# Altium footprint library ICs And Semiconductors THD.PcbLib: 507 footprints (part 17 of 32)
Each footprint in its own frame and in the unit in brackets; x right, y up, seen from the top. Pads: shape width x height; smd on the part's side, far side on the other; paste and mask are expansions set on the pad; w line width, h text height; cw(c..) or ccw(c..) is an arc to the next point about the centre after c.
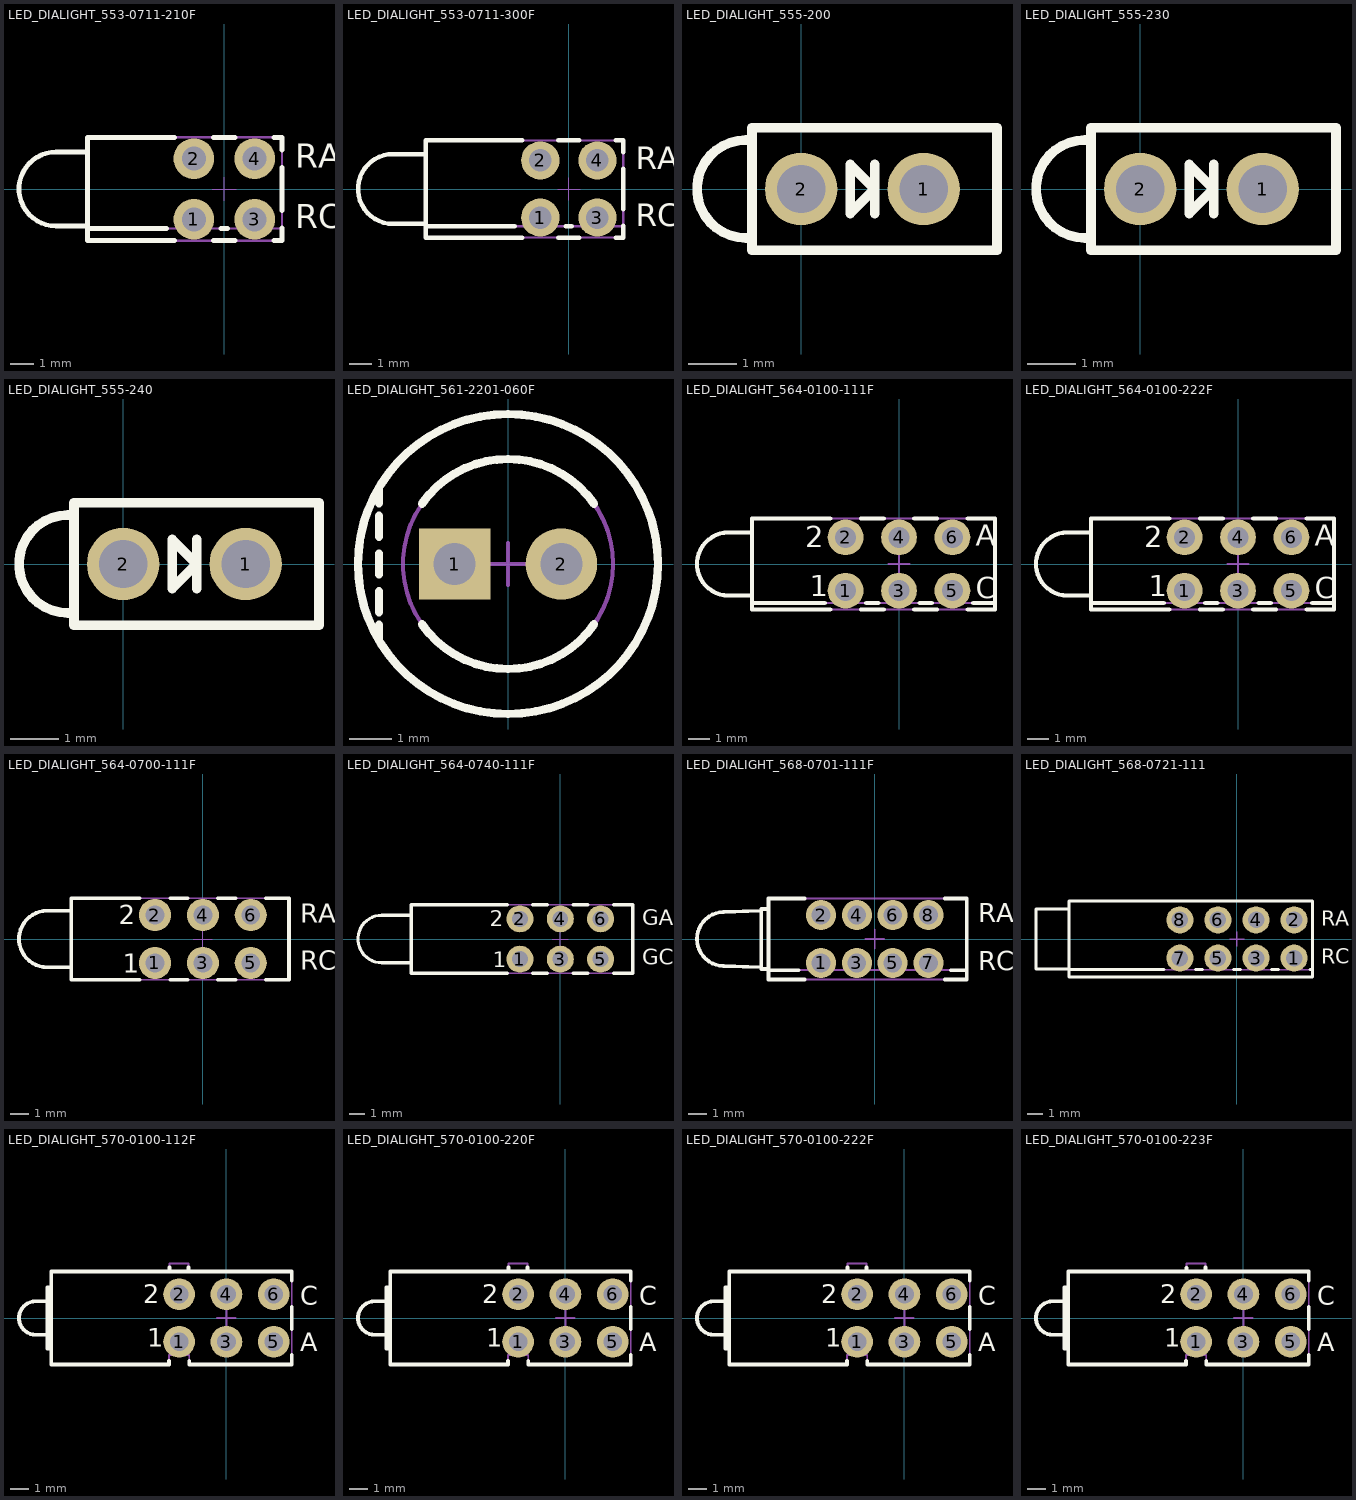
[diagram p16: the footprints below, top view; thin cyan lines are the x and y axes]

## LED_DIALIGHT_553-0711-210F [mm] "Bi-Level 2x3mm Bi-Color Red/Green, LED CBI Circuit Board Indicator"
height 9.65
pads (4):
  round 1.7 hole 1: 1(-1.27,-1.27) 2(-1.27,1.27) 3(1.27,-1.27) 4(1.27,1.27)
Top Overlay:
  lines w0.2: -7.036,1.549 -5.715,1.549 ; -7.022,1.549 ccw(c-7.036,0) -7.036,-1.549 -5.715,-1.549 ; -5.715,-1.651 -2.408,-1.651 ; -2.076,-2.159 -5.715,-2.159 -5.715,2.159 -2.076,2.159 ; -0.464,-2.159 0.464,-2.159 ; -0.464,2.159 0.464,2.159 ; -0.132,-1.651 0.132,-1.651 ; 2.076,-2.159 2.413,-2.159 2.413,-1.635 ; 2.076,2.159 2.413,2.159 2.413,1.635 ; 2.413,-0.905 2.413,0.905
  text "RA" at 2.962,0.889 h1
  text "RC" at 2.962,-1.651 h1
Notvisible:
  lines w0.05: -1.77,-1.27 -1.27,-1.27 ; -1.77,1.27 -1.27,1.27 ; -1.27,-1.77 -1.27,-1.27 ; -1.27,-0.77 -1.27,-1.27 ; -1.27,0.77 -1.27,1.27 ; -1.27,1.77 -1.27,1.27 ; -0.77,-1.27 -1.27,-1.27 ; -0.77,1.27 -1.27,1.27 ; -0.5,0 0,0 ; 0,-0.5 0,0 ; 0,0.5 0,0 ; 0.5,0 0,0 ; 0.77,-1.27 1.27,-1.27 ; 0.77,1.27 1.27,1.27 ; 1.27,-1.77 1.27,-1.27 ; 1.27,-0.77 1.27,-1.27 ; 1.27,0.77 1.27,1.27 ; 1.27,1.77 1.27,1.27 ; 1.77,-1.27 1.27,-1.27 ; 1.77,1.27 1.27,1.27
Mechanical 14:
  lines w0.1: -7.036,1.549 -5.715,1.549 ; -7.022,1.549 ccw(c-7.036,0) -7.036,-1.549 -5.715,-1.549 ; -5.715,-1.651 2.413,-1.651 ; -5.715,-2.159 -5.715,2.159 2.413,2.159 2.413,-2.159 -5.715,-2.159
  text "RA" at 2.963,0.889 h1
  text "RC" at 2.963,-1.651 h1
3D body "LED_DIALIGHT_553-0711-210F.stp": height 9.65, standoff -3.68, extent -8.585,-2.159 2.413,2.159

## LED_DIALIGHT_553-0711-300F [mm] "Bi-Level 2x3mm Bi-Color Red/Green, LED CBI Circuit Board Indicator"
height 9.65
pads (4):
  round 1.7 hole 1: 1(-1.27,-1.27) 2(-1.27,1.27) 3(1.27,-1.27) 4(1.27,1.27)
Top Overlay:
  lines w0.2: -7.826,1.549 -6.355,1.549 ; -7.812,1.549 ccw(c-7.826,0) -7.826,-1.549 -6.355,-1.549 ; -6.355,-1.651 -2.408,-1.651 ; -2.076,-2.159 -6.355,-2.159 -6.355,2.159 -2.076,2.159 ; -0.464,-2.159 0.464,-2.159 ; -0.464,2.159 0.464,2.159 ; -0.132,-1.651 0.132,-1.651 ; 2.076,-2.159 2.413,-2.159 2.413,-1.635 ; 2.076,2.159 2.413,2.159 2.413,1.635 ; 2.413,-0.905 2.413,0.905
  text "RC" at 2.962,-1.651 h1
  text "RA" at 2.962,0.889 h1
Notvisible:
  lines w0.05: -1.77,-1.27 -1.27,-1.27 ; -1.77,1.27 -1.27,1.27 ; -1.27,-1.77 -1.27,-1.27 ; -1.27,-0.77 -1.27,-1.27 ; -1.27,0.77 -1.27,1.27 ; -1.27,1.77 -1.27,1.27 ; -0.77,-1.27 -1.27,-1.27 ; -0.77,1.27 -1.27,1.27 ; -0.5,0 0,0 ; 0,-0.5 0,0 ; 0,0.5 0,0 ; 0.5,0 0,0 ; 0.77,-1.27 1.27,-1.27 ; 0.77,1.27 1.27,1.27 ; 1.27,-1.77 1.27,-1.27 ; 1.27,-0.77 1.27,-1.27 ; 1.27,0.77 1.27,1.27 ; 1.27,1.77 1.27,1.27 ; 1.77,-1.27 1.27,-1.27 ; 1.77,1.27 1.27,1.27
Mechanical 14:
  lines w0.1: -7.826,1.549 -6.355,1.549 ; -7.812,1.549 ccw(c-7.826,0) -7.826,-1.549 -6.355,-1.549 ; -6.355,-1.651 2.413,-1.651 ; -6.355,-2.159 2.413,-2.159 2.413,2.159 -6.355,2.159 -6.355,-2.159
  text "RC" at 2.963,-1.651 h1
  text "RA" at 2.963,0.889 h1
3D body "LED_DIALIGHT_553-0711-300F.stp": height 9.65, standoff -3.68, extent -9.375,-2.159 2.413,2.159

## LED_DIALIGHT_555-200 [mm] "Single 2mm Red LED, Body 5.08x2.54mm, Pin spacing 2.54mm"
height 6.35
pads (2):
  round 1.5 hole 1: 1(2.54,0) 2(0,0)
Top Overlay:
  lines w0.2: -1.02,-1.015 -1.145,-1.015 cw(c-1.145,0) -1.145,1.015 -1.02,1.015 ; 1.524,-0.508 1.524,0.508 ; -1.02,-1.27 -1.02,1.27 4.06,1.27 4.06,-1.27 -1.02,-1.27 ; 1.016,-0.508 1.016,0.508 1.524,0 1.016,-0.508
Notvisible:
  lines w0.05: -0.127,-0.343 0.127,-0.343 0.127,0.343 -0.127,0.343 -0.127,-0.343 ; 2.413,-0.343 2.667,-0.343 2.667,0.343 2.413,0.343 2.413,-0.343
Mechanical 14:
  lines w0.1: -1.02,-1.015 -1.145,-1.015 cw(c-1.145,0) -1.145,1.015 -1.02,1.015 ; 1.524,-0.508 1.524,0.508 ; -1.02,-1.27 -1.02,1.27 4.06,1.27 4.06,-1.27 -1.02,-1.27 ; 1.016,-0.508 1.016,0.508 1.524,0 1.016,-0.508
3D body "LED_DIALIGHT_555-200.stp": height 6.35, standoff -3.6, extent -2.16,-1.27 4.06,1.27

## LED_DIALIGHT_555-230 [mm] "Single 2mm Green LED, Body 5.08x2.54mm, Pin spacing 2.54mm"
height 6.35
pads (2):
  round 1.5 hole 1: 1(2.54,0) 2(0,0)
Top Overlay:
  lines w0.2: -1.02,-1.015 -1.145,-1.015 cw(c-1.145,0) -1.145,1.015 -1.02,1.015 ; 1.524,-0.508 1.524,0.508 ; -1.02,-1.27 -1.02,1.27 4.06,1.27 4.06,-1.27 -1.02,-1.27 ; 1.016,-0.508 1.016,0.508 1.524,0 1.016,-0.508
Notvisible:
  lines w0.05: -0.127,-0.343 0.127,-0.343 0.127,0.343 -0.127,0.343 -0.127,-0.343 ; 2.413,-0.343 2.667,-0.343 2.667,0.343 2.413,0.343 2.413,-0.343
Mechanical 14:
  lines w0.1: -1.02,-1.015 -1.145,-1.015 cw(c-1.145,0) -1.145,1.015 -1.02,1.015 ; 1.524,-0.508 1.524,0.508 ; -1.02,-1.27 -1.02,1.27 4.06,1.27 4.06,-1.27 -1.02,-1.27 ; 1.016,-0.508 1.016,0.508 1.524,0 1.016,-0.508
3D body "LED_DIALIGHT_555-230.stp": height 6.35, standoff -3.6, extent -2.16,-1.27 4.06,1.27

## LED_DIALIGHT_555-240 [mm] "Single 2mm Yellow LED, Body 5.08x2.54mm, Pin spacing 2.54mm"
height 6.35
pads (2):
  round 1.5 hole 1: 1(2.54,0) 2(0,0)
Top Overlay:
  lines w0.2: -1.02,-1.015 -1.145,-1.015 cw(c-1.145,0) -1.145,1.015 -1.02,1.015 ; 1.524,-0.508 1.524,0.508 ; -1.02,-1.27 4.06,-1.27 4.06,1.27 -1.02,1.27 -1.02,-1.27 ; 1.016,-0.508 1.524,0 1.016,0.508 1.016,-0.508
Notvisible:
  lines w0.05: -0.127,-0.343 -0.127,0.343 0.127,0.343 0.127,-0.343 -0.127,-0.343 ; 2.413,-0.343 2.413,0.343 2.667,0.343 2.667,-0.343 2.413,-0.343
Mechanical 14:
  lines w0.1: -1.02,-1.015 -1.145,-1.015 cw(c-1.145,0) -1.145,1.015 -1.02,1.015 ; 1.524,-0.508 1.524,0.508 ; -1.02,-1.27 4.06,-1.27 4.06,1.27 -1.02,1.27 -1.02,-1.27 ; 1.016,-0.508 1.524,0 1.016,0.508 1.016,-0.508
3D body "LED_DIALIGHT_555-240.stp": height 6.35, standoff -3.6, extent -2.16,-1.27 4.06,1.27

## LED_DIALIGHT_561-2201-060F [mm] "Single Vertical 5mm Green LED With Housing Stand-off (D 7.1mmx H 9.52mm), Overall Height 15.24mm"
height 15.24
pads (2):
  rect 1.7x1.7 hole 1: 1(-1.27,0)
  round 1.7 hole 1: 2(1.27,0)
Top Overlay:
  circle w0.2: c0,0 r3.57
  lines w0.2: -3.07,-1.822 -3.07,-1.45 ; -3.07,-1.15 -3.07,-0.65 ; -3.07,-0.25 -3.07,0.25 ; -3.07,0.65 -3.07,1.15 ; -3.07,1.45 -3.07,1.822 ; -2.048,-1.434 ccw(c0,0) 2.048,-1.434 ; -2.048,1.434 cw(c0,0) 2.048,1.434
Notvisible:
  lines w0.1: -1.77,0 -1.27,0 ; -1.27,-0.5 -1.27,0 ; -1.27,0.5 -1.27,0 ; -0.77,0 -1.27,0 ; -0.5,0 0,0 ; 0,-0.5 0,0 ; 0,0.5 0,0 ; 0.5,0 0,0 ; 0.77,0 1.27,0 ; 1.27,-0.5 1.27,0 ; 1.27,0.5 1.27,0 ; 1.77,0 1.27,0
Mechanical 14:
  circle w0.1: c0,0 r3.57
  circle w0.1: c0,0 r2.5
  lines w0.1: -3.07,-1.822 -3.07,-1.45 ; -3.07,-1.15 -3.07,-0.65 ; -3.07,-0.25 -3.07,0.25 ; -3.07,0.65 -3.07,1.15 ; -3.07,1.45 -3.07,1.822
3D body "LED_DIALIGHT_561-2201-060F.stp": height 15.24, standoff -3.8, extent -3.57,-3.57 3.57,3.57

## LED_DIALIGHT_564-0100-111F [mm] "3x Red LED 3mm PCB Edge Mounting DIALIGHT 564 Series"
height 15.24
pads (6):
  round 1.7 hole 1: 1(-2.54,-1.27) 2(-2.54,1.27) 3(0,-1.27) 4(0,1.27) 5(2.54,-1.27) 6(2.54,1.27)
Top Overlay:
  lines w0.2: -6.99,-1.86 -3.527,-1.86 ; -6.99,-1.5 -8.106,-1.5 cw(c-8.106,0) -8.106,1.5 -6.99,1.5 ; -3.268,-2.16 -6.99,-2.16 -6.99,2.16 -3.268,2.16 ; -1.812,-2.16 -0.728,-2.16 ; -1.812,2.16 -0.728,2.16 ; -1.553,-1.86 -0.987,-1.86 ; 0.728,-2.16 1.812,-2.16 ; 0.728,2.16 1.812,2.16 ; 0.987,-1.86 1.553,-1.86 ; 3.268,-2.16 4.57,-2.16 4.57,2.16 3.268,2.16 ; 3.527,-1.86 4.57,-1.86
  text "1" at -4.243,-1.53 h1
  text "2" at -4.458,0.79 h1
  text "C" at 3.66,-1.635 h1
  text "A" at 3.66,0.86 h1
Notvisible:
  lines w0.1: -3.04,-1.27 -2.54,-1.27 ; -3.04,1.27 -2.54,1.27 ; -2.54,-1.77 -2.54,-1.27 ; -2.54,-0.77 -2.54,-1.27 ; -2.54,0.77 -2.54,1.27 ; -2.54,1.77 -2.54,1.27 ; -2.04,-1.27 -2.54,-1.27 ; -2.04,1.27 -2.54,1.27 ; -0.5,-1.27 0,-1.27 ; -0.5,0 0,0 ; -0.5,1.27 0,1.27 ; 0,-1.77 0,-1.27 ; 0,-0.77 0,-1.27 ; 0,-0.5 0,0 ; 0,0.5 0,0 ; 0,0.77 0,1.27 ; 0,1.77 0,1.27 ; 0.5,-1.27 0,-1.27 ; 0.5,0 0,0 ; 0.5,1.27 0,1.27 ; 2.04,-1.27 2.54,-1.27 ; 2.04,1.27 2.54,1.27 ; 2.54,-1.77 2.54,-1.27 ; 2.54,-0.77 2.54,-1.27 ; 2.54,0.77 2.54,1.27 ; 2.54,1.77 2.54,1.27 ; 3.04,-1.27 2.54,-1.27 ; 3.04,1.27 2.54,1.27
Mechanical 14:
  lines w0.1: -6.99,-1.86 4.57,-1.86 ; -6.99,-1.5 -8.106,-1.5 cw(c-8.106,0) -8.106,1.5 -6.99,1.5 ; -6.99,-2.16 -6.99,2.16 4.57,2.16 4.57,-2.16 -6.99,-2.16
  text "1" at -4.243,-1.53 h1
  text "2" at -4.458,0.79 h1
  text "C" at 3.66,-1.635 h1
  text "A" at 3.66,0.86 h1
3D body "LED_DIALIGHT_564-0100-111F.stp": height 15.24, standoff -3.2, extent -9.606,-2.16 4.57,2.16

## LED_DIALIGHT_564-0100-222F [mm] "3x Green LED 3mm PCB Edge Mounting DIALIGHT 564 Series"
height 15.24
pads (6):
  round 1.7 hole 1: 1(-2.54,-1.27) 2(-2.54,1.27) 3(0,-1.27) 4(0,1.27) 5(2.54,-1.27) 6(2.54,1.27)
Top Overlay:
  lines w0.2: -6.99,-1.86 -3.527,-1.86 ; -6.99,-1.5 -8.106,-1.5 cw(c-8.106,0) -8.106,1.5 -6.99,1.5 ; -3.268,-2.16 -6.99,-2.16 -6.99,2.16 -3.268,2.16 ; -1.812,-2.16 -0.728,-2.16 ; -1.812,2.16 -0.728,2.16 ; -1.553,-1.86 -0.987,-1.86 ; 0.728,-2.16 1.812,-2.16 ; 0.728,2.16 1.812,2.16 ; 0.987,-1.86 1.553,-1.86 ; 3.268,-2.16 4.57,-2.16 4.57,2.16 3.268,2.16 ; 3.527,-1.86 4.57,-1.86
  text "1" at -4.243,-1.53 h1
  text "2" at -4.458,0.79 h1
  text "C" at 3.66,-1.635 h1
  text "A" at 3.66,0.86 h1
Notvisible:
  lines w0.1: -3.04,-1.27 -2.54,-1.27 ; -3.04,1.27 -2.54,1.27 ; -2.54,-1.77 -2.54,-1.27 ; -2.54,-0.77 -2.54,-1.27 ; -2.54,0.77 -2.54,1.27 ; -2.54,1.77 -2.54,1.27 ; -2.04,-1.27 -2.54,-1.27 ; -2.04,1.27 -2.54,1.27 ; -0.5,-1.27 0,-1.27 ; -0.5,0 0,0 ; -0.5,1.27 0,1.27 ; 0,-1.77 0,-1.27 ; 0,-0.77 0,-1.27 ; 0,-0.5 0,0 ; 0,0.5 0,0 ; 0,0.77 0,1.27 ; 0,1.77 0,1.27 ; 0.5,-1.27 0,-1.27 ; 0.5,0 0,0 ; 0.5,1.27 0,1.27 ; 2.04,-1.27 2.54,-1.27 ; 2.04,1.27 2.54,1.27 ; 2.54,-1.77 2.54,-1.27 ; 2.54,-0.77 2.54,-1.27 ; 2.54,0.77 2.54,1.27 ; 2.54,1.77 2.54,1.27 ; 3.04,-1.27 2.54,-1.27 ; 3.04,1.27 2.54,1.27
Mechanical 14:
  lines w0.1: -6.99,-1.86 4.57,-1.86 ; -6.99,-1.5 -8.106,-1.5 cw(c-8.106,0) -8.106,1.5 -6.99,1.5 ; -6.99,-2.16 -6.99,2.16 4.57,2.16 4.57,-2.16 -6.99,-2.16
  text "1" at -4.243,-1.53 h1
  text "2" at -4.458,0.79 h1
  text "C" at 3.66,-1.635 h1
  text "A" at 3.66,0.86 h1
3D body "LED_DIALIGHT_564-0100-222F.stp": height 15.24, standoff -3.2, extent -9.606,-2.16 4.57,2.16

## LED_DIALIGHT_564-0700-111F [mm] "3x Red-Green Led 3mm PCB Edge Mounting DIALIGHT 564 Series"
height 15.24
pads (6):
  round 1.7 hole 1: 1(-2.54,-1.27) 2(-2.54,1.27) 3(0,-1.27) 4(0,1.27) 5(2.54,-1.27) 6(2.54,1.27)
Top Overlay:
  lines w0.2: -8.26,1.499 ccw(c-8.255,0) -8.255,-1.499 -6.985,-1.499 ; -8.255,1.499 -6.985,1.499 ; -3.346,-2.159 -6.985,-2.159 -6.985,2.159 -3.346,2.159 ; -1.734,-2.159 -0.806,-2.159 ; -1.734,2.159 -0.806,2.159 ; 0.806,-2.159 1.734,-2.159 ; 0.806,2.159 1.734,2.159 ; 3.346,-2.159 4.572,-2.159 4.572,2.159 3.346,2.159
  text "1" at -4.243,-1.78 h1
  text "2" at -4.458,0.79 h1
  text "RC" at 5.16,-1.635 h1
  text "RA" at 5.16,0.86 h1
Notvisible:
  lines w0.05: -3.04,-1.27 -2.54,-1.27 ; -3.04,1.27 -2.54,1.27 ; -2.54,-1.77 -2.54,-1.27 ; -2.54,-0.77 -2.54,-1.27 ; -2.54,0.77 -2.54,1.27 ; -2.54,1.77 -2.54,1.27 ; -2.04,-1.27 -2.54,-1.27 ; -2.04,1.27 -2.54,1.27 ; -0.5,-1.27 0,-1.27 ; -0.5,0 0,0 ; -0.5,1.27 0,1.27 ; 0,-1.77 0,-1.27 ; 0,-0.77 0,-1.27 ; 0,-0.5 0,0 ; 0,0.5 0,0 ; 0,0.77 0,1.27 ; 0,1.77 0,1.27 ; 0.5,-1.27 0,-1.27 ; 0.5,0 0,0 ; 0.5,1.27 0,1.27 ; 2.04,-1.27 2.54,-1.27 ; 2.04,1.27 2.54,1.27 ; 2.54,-1.77 2.54,-1.27 ; 2.54,-0.77 2.54,-1.27 ; 2.54,0.77 2.54,1.27 ; 2.54,1.77 2.54,1.27 ; 3.04,-1.27 2.54,-1.27 ; 3.04,1.27 2.54,1.27
Mechanical 14:
  lines w0.1: -8.26,1.499 ccw(c-8.255,0) -8.255,-1.499 -6.985,-1.499 ; -8.255,1.499 -6.985,1.499 ; -6.985,-2.159 -6.985,2.159 4.572,2.159 4.572,-2.159 -6.985,-2.159
  text "1" at -4.243,-1.78 h1
  text "2" at -4.458,0.79 h1
  text "RC" at 5.16,-1.635 h1
  text "RA" at 5.16,0.86 h1
3D body "LED_DIALIGHT_564-0700-111F.stp": height 15.24, standoff -3.68, extent -9.754,-2.159 4.572,2.159

## LED_DIALIGHT_564-0740-111F [mm] "3x Red-Green Led 3mm PCB Edge Mounting DIALIGHT 564 Series"
height 15.24
pads (6):
  round 1.7 hole 1: 1(-2.54,-1.27) 2(-2.54,1.27) 3(0,-1.27) 4(0,1.27) 5(2.54,-1.27) 6(2.54,1.27)
Top Overlay:
  lines w0.2: -11.257,1.499 ccw(c-11.252,0) -11.252,-1.499 -9.398,-1.499 ; -11.252,1.499 -9.398,1.499 ; -3.346,-2.159 -9.398,-2.159 -9.398,2.159 -3.346,2.159 ; -1.734,-2.159 -0.806,-2.159 ; -1.734,2.159 -0.806,2.159 ; 0.806,-2.159 1.734,-2.159 ; 0.806,2.159 1.734,2.159 ; 3.346,-2.159 4.572,-2.159 4.572,2.159 3.346,2.159
  text "1" at -4.243,-1.78 h1
  text "2" at -4.458,0.79 h1
  text "GC" at 5.16,-1.635 h1
  text "GA" at 5.16,0.86 h1
Notvisible:
  lines w0.05: -3.04,-1.27 -2.54,-1.27 ; -3.04,1.27 -2.54,1.27 ; -2.54,-1.77 -2.54,-1.27 ; -2.54,-0.77 -2.54,-1.27 ; -2.54,0.77 -2.54,1.27 ; -2.54,1.77 -2.54,1.27 ; -2.04,-1.27 -2.54,-1.27 ; -2.04,1.27 -2.54,1.27 ; -0.5,-1.27 0,-1.27 ; -0.5,0 0,0 ; -0.5,1.27 0,1.27 ; 0,-1.77 0,-1.27 ; 0,-0.77 0,-1.27 ; 0,-0.5 0,0 ; 0,0.5 0,0 ; 0,0.77 0,1.27 ; 0,1.77 0,1.27 ; 0.5,-1.27 0,-1.27 ; 0.5,0 0,0 ; 0.5,1.27 0,1.27 ; 2.04,-1.27 2.54,-1.27 ; 2.04,1.27 2.54,1.27 ; 2.54,-1.77 2.54,-1.27 ; 2.54,-0.77 2.54,-1.27 ; 2.54,0.77 2.54,1.27 ; 2.54,1.77 2.54,1.27 ; 3.04,-1.27 2.54,-1.27 ; 3.04,1.27 2.54,1.27
Mechanical 14:
  lines w0.1: -11.257,1.499 ccw(c-11.252,0) -11.252,-1.499 -9.398,-1.499 ; -11.252,1.499 -9.398,1.499 ; -9.398,-2.159 4.572,-2.159 4.572,2.159 -9.398,2.159 -9.398,-2.159
  text "1" at -4.243,-1.78 h1
  text "2" at -4.458,0.79 h1
  text "GC" at 5.16,-1.635 h1
  text "GA" at 5.16,0.86 h1
3D body "LED_DIALIGHT_564-0740-111F.stp": height 15.24, standoff -3.2, extent -12.751,-2.159 4.572,2.159

## LED_DIALIGHT_568-0701-111F [mm] "Quad-Level 4x3mm Bi-Color Red/Green, LED CBI Circuit Board Indicator"
height 20.32
pads (8):
  round 1.6 hole 1: 1(-2.857,-1.27) 2(-2.857,1.27) 3(-0.952,-1.27) 4(-0.952,1.27) 5(0.953,-1.27) 6(0.953,1.27) 7(2.858,-1.27) 8(2.858,1.27)
Top Overlay:
  lines w0.2: -6.032,-1.499 -8.05,-1.441 cw(c-8.014,0) -8.05,1.441 -6.032,1.499 ; -5.651,-1.659 -4.045,-1.659 ; -5.651,-1.6 -6.032,-1.6 -6.032,1.6 -5.651,1.6 ; -3.736,-2.159 -5.651,-2.159 -5.651,2.159 -3.736,2.159 ; 3.736,-2.159 4.89,-2.159 4.89,2.159 3.736,2.159 ; 4.045,-1.659 4.89,-1.659
  text "RA" at 5.502,0.889 h1
  text "RC" at 5.502,-1.651 h1
Notvisible:
  lines w0.1: -3.357,-1.27 -2.857,-1.27 ; -3.357,1.27 -2.857,1.27 ; -2.857,-1.77 -2.857,-1.27 ; -2.857,-0.77 -2.857,-1.27 ; -2.857,0.77 -2.857,1.27 ; -2.857,1.77 -2.857,1.27 ; -2.357,-1.27 -2.857,-1.27 ; -2.357,1.27 -2.857,1.27 ; -1.452,-1.27 -0.952,-1.27 ; -1.452,1.27 -0.952,1.27 ; -0.952,-1.77 -0.952,-1.27 ; -0.952,-0.77 -0.952,-1.27 ; -0.952,0.77 -0.952,1.27 ; -0.952,1.77 -0.952,1.27 ; -0.5,0 0,0 ; -0.452,-1.27 -0.952,-1.27 ; -0.452,1.27 -0.952,1.27 ; 0,-0.5 0,0 ; 0,0.5 0,0 ; 0.453,-1.27 0.953,-1.27 ; 0.453,1.27 0.953,1.27 ; 0.5,0 0,0 ; 0.953,-1.77 0.953,-1.27 ; 0.953,-0.77 0.953,-1.27 ; 0.953,0.77 0.953,1.27 ; 0.953,1.77 0.953,1.27 ; 1.453,-1.27 0.953,-1.27 ; 1.453,1.27 0.953,1.27 ; 2.358,-1.27 2.858,-1.27 ; 2.358,1.27 2.858,1.27 ; 2.858,-1.77 2.858,-1.27 ; 2.858,-0.77 2.858,-1.27 ; 2.858,0.77 2.858,1.27 ; 2.858,1.77 2.858,1.27 ; 3.358,-1.27 2.858,-1.27 ; 3.358,1.27 2.858,1.27
Mechanical 14:
  lines w0.1: -6.032,-1.499 -8.05,-1.441 cw(c-8.014,0) -8.05,1.441 -6.032,1.499 ; -5.651,-1.659 4.89,-1.659 ; -5.651,-1.6 -6.032,-1.6 -6.032,1.6 -5.651,1.6 ; -5.651,-2.159 -5.651,2.159 4.89,2.159 4.89,-2.159 -5.651,-2.159
  text "RA" at 5.503,0.889 h1
  text "RC" at 5.503,-1.651 h1
3D body "LED_DIALIGHT_568-0701-111F.stp": height 20.32, standoff -3.68, extent -9.455,-2.159 4.89,2.159

## LED_DIALIGHT_568-0721-111 [mm] "Quad-Level 4x2mm Rectangular Bi-Color Red/Green, LED CBI Circuit Board Indicator"
height 12.7
pads (8):
  round 1.8 hole 1.1: 1(3.81,-1.27) 2(3.81,1.27) 3(1.27,-1.27) 4(1.27,1.27) 5(-1.27,-1.27) 6(-1.27,1.27) 7(-3.81,-1.27) 8(-3.81,1.27)
Top Overlay:
  lines w0.2: -11.2,-2.04 -4.857,-2.04 ; -11.2,-1.995 -13.41,-1.995 -13.41,1.995 -11.2,1.995 ; -2.763,-2.04 -2.317,-2.04 ; -0.223,-2.04 0.223,-2.04 ; 2.317,-2.04 2.763,-2.04 ; 4.857,-2.04 5.03,-2.04 ; -11.2,-2.54 5.03,-2.54 5.03,2.54 -11.2,2.54 -11.2,-2.54
  text "RC" at 5.605,-1.651 h1
  text "RA" at 5.605,0.889 h1
Notvisible:
  lines w0.1: -4.31,-1.27 -3.81,-1.27 ; -4.31,1.27 -3.81,1.27 ; -3.81,-1.77 -3.81,-1.27 ; -3.81,-0.77 -3.81,-1.27 ; -3.81,0.77 -3.81,1.27 ; -3.81,1.77 -3.81,1.27 ; -3.31,-1.27 -3.81,-1.27 ; -3.31,1.27 -3.81,1.27 ; -1.77,-1.27 -1.27,-1.27 ; -1.77,1.27 -1.27,1.27 ; -1.27,-1.77 -1.27,-1.27 ; -1.27,-0.77 -1.27,-1.27 ; -1.27,0.77 -1.27,1.27 ; -1.27,1.77 -1.27,1.27 ; -0.77,-1.27 -1.27,-1.27 ; -0.77,1.27 -1.27,1.27 ; -0.5,0 0,0 ; 0,-0.5 0,0 ; 0,0.5 0,0 ; 0.5,0 0,0 ; 0.77,-1.27 1.27,-1.27 ; 0.77,1.27 1.27,1.27 ; 1.27,-1.77 1.27,-1.27 ; 1.27,-0.77 1.27,-1.27 ; 1.27,0.77 1.27,1.27 ; 1.27,1.77 1.27,1.27 ; 1.77,-1.27 1.27,-1.27 ; 1.77,1.27 1.27,1.27 ; 3.31,-1.27 3.81,-1.27 ; 3.31,1.27 3.81,1.27 ; 3.81,-1.77 3.81,-1.27 ; 3.81,-0.77 3.81,-1.27 ; 3.81,0.77 3.81,1.27 ; 3.81,1.77 3.81,1.27 ; 4.31,-1.27 3.81,-1.27 ; 4.31,1.27 3.81,1.27
Mechanical 14:
  lines w0.1: -11.2,-2.04 5.03,-2.04 ; -11.2,-1.995 -13.41,-1.995 -13.41,1.995 -11.2,1.995 ; -11.2,-2.54 5.03,-2.54 5.03,2.54 -11.2,2.54 -11.2,-2.54
  text "RA" at 5.605,0.889 h1
  text "RC" at 5.605,-1.651 h1
3D body "LED_DIALIGHT_568-0721-111.stp": height 12.7, standoff -3.05, extent -13.41,-2.54 5.03,2.54

## LED_DIALIGHT_570-0100-112F [mm] "3x 2mm LED (Top: Red , Middle: Red, Bot: Green) PCB Edge Mounting DIALIGHT 570 Serie"
height 10.41
pads (6):
  round 1.7 hole 1: 1(-2.54,-1.27) 2(-2.54,1.27) 3(0,-1.27) 4(0,1.27) 5(2.54,-1.27) 6(2.54,1.27)
Top Overlay:
  lines w0.2: -9.59,-0.9 -10.22,-0.9 cw(c-10.22,0) -10.22,0.9 -9.59,0.9 ; -9.39,-1.651 -9.59,-1.651 -9.59,1.651 -9.39,1.651 ; -9.39,2.485 -9.39,-2.485 -3.086,-2.485 -3.086,-2.3 ; -3.086,2.493 -9.39,2.493 3.5,2.493 ; -3.048,2.493 -3.048,2.705 ; -2.032,2.493 -2.032,2.705 ; -1.994,-2.3 -1.994,-2.485 3.5,-2.485 3.5,-1.977 ; -1.994,2.493 3.5,2.493 ; 3.5,-0.6 3.5,0.6 ; 3.5,2 3.5,2.493
  text "2" at -4.458,0.79 h1
  text "1" at -4.243,-1.53 h1
  text "C" at 3.96,0.705 h1
  text "A" at 3.96,-1.79 h1
Notvisible:
  lines w0.1: -3.04,-1.27 -2.54,-1.27 ; -3.04,-1.27 -2.54,-1.27 ; -3.04,-1.27 -2.54,-1.27 ; -3.04,1.27 -2.54,1.27 ; -3.04,1.27 -2.54,1.27 ; -3.04,1.27 -2.54,1.27 ; -2.54,-1.77 -2.54,-1.27 ; -2.54,-1.77 -2.54,-1.27 ; -2.54,-1.77 -2.54,-1.27 ; -2.54,-1.27 -2.04,-1.27 ; -2.54,-1.27 -2.54,-0.77 ; -2.54,-1.27 -2.04,-1.27 ; -2.54,-1.27 -2.54,-0.77 ; -2.54,-1.27 -2.04,-1.27 ; -2.54,-1.27 -2.54,-0.77 ; -2.54,0.77 -2.54,1.27 ; -2.54,0.77 -2.54,1.27 ; -2.54,0.77 -2.54,1.27 ; -2.54,1.27 -2.04,1.27 ; -2.54,1.27 -2.54,1.77 ; -2.54,1.27 -2.04,1.27 ; -2.54,1.27 -2.54,1.77 ; -2.54,1.27 -2.04,1.27 ; -2.54,1.27 -2.54,1.77 ; -0.5,-1.27 0,-1.27 ; -0.5,-1.27 0,-1.27 ; -0.5,-1.27 0,-1.27 ; -0.5,0 0,0 ; -0.5,0 0,0 ; -0.5,0 0,0 ; -0.5,1.27 0,1.27 ; -0.5,1.27 0,1.27 ; -0.5,1.27 0,1.27 ; 0,-1.77 0,-1.27 ; 0,-1.77 0,-1.27 ; 0,-1.77 0,-1.27 ; 0,-1.27 0.5,-1.27 ; 0,-1.27 0,-0.77 ; 0,-1.27 0.5,-1.27 ; 0,-1.27 0,-0.77 ; 0,-1.27 0.5,-1.27 ; 0,-1.27 0,-0.77 ; 0,-0.5 0,0 ; 0,-0.5 0,0 ; 0,-0.5 0,0 ; 0,0 0.5,0 ; 0,0 0,0.5 ; 0,0 0.5,0 ; 0,0 0,0.5 ; 0,0 0.5,0 ; 0,0 0,0.5 ; 0,0.77 0,1.27 ; 0,0.77 0,1.27 ; 0,0.77 0,1.27 ; 0,1.27 0.5,1.27 ; 0,1.27 0,1.77 ; 0,1.27 0.5,1.27 ; 0,1.27 0,1.77 ; 0,1.27 0.5,1.27 ; 0,1.27 0,1.77 ; 2.04,-1.27 2.54,-1.27 ; 2.04,-1.27 2.54,-1.27 ; 2.04,-1.27 2.54,-1.27 ; 2.04,1.27 2.54,1.27 ; 2.04,1.27 2.54,1.27 ; 2.04,1.27 2.54,1.27 ; 2.54,-1.77 2.54,-1.27 ; 2.54,-1.77 2.54,-1.27 ; 2.54,-1.77 2.54,-1.27 ; 2.54,-1.27 3.04,-1.27 ; 2.54,-1.27 2.54,-0.77 ; 2.54,-1.27 3.04,-1.27 ; 2.54,-1.27 2.54,-0.77 ; 2.54,-1.27 3.04,-1.27 ; 2.54,-1.27 2.54,-0.77 ; 2.54,0.77 2.54,1.27 ; 2.54,0.77 2.54,1.27 ; 2.54,0.77 2.54,1.27 ; 2.54,1.27 3.04,1.27 ; 2.54,1.27 2.54,1.77 ; 2.54,1.27 3.04,1.27 ; 2.54,1.27 2.54,1.77 ; 2.54,1.27 3.04,1.27 ; 2.54,1.27 2.54,1.77
Mechanical 14:
  lines w0.1: -3.048,2.485 -3.048,2.917 ; -2.032,2.485 -2.032,2.917 ; -10.22,-0.9 cw(c-10.22,0) -10.22,0.9 ; -10.22,-0.9 cw(c-10.22,0) -10.22,0.9 ; -10.22,-0.9 cw(c-10.22,0) -10.22,0.9 ; -10.22,-0.9 -9.59,-0.9 ; -10.22,-0.9 -9.59,-0.9 ; -10.22,-0.9 -9.59,-0.9 ; -10.22,0.9 -9.59,0.9 ; -10.22,0.9 -9.59,0.9 ; -10.22,0.9 -9.59,0.9 ; -9.59,-1.651 -9.39,-1.651 ; -9.59,-1.651 -9.59,1.651 ; -9.59,-1.651 -9.39,-1.651 ; -9.59,-1.651 -9.59,1.651 ; -9.59,-1.651 -9.39,-1.651 ; -9.59,-1.651 -9.59,1.651 ; -9.59,1.651 -9.39,1.651 ; -9.59,1.651 -9.39,1.651 ; -9.59,1.651 -9.39,1.651 ; -9.39,-2.485 -3.086,-2.485 ; -9.39,-2.485 -9.39,2.485 ; -9.39,-2.485 -3.086,-2.485 ; -9.39,-2.485 -9.39,2.485 ; -9.39,-2.485 -3.086,-2.485 ; -9.39,-2.485 -9.39,2.485 ; -9.39,2.493 3.5,2.493 ; -9.39,2.493 -3.048,2.493 ; -9.39,2.493 -3.048,2.493 ; -3.086,-2.485 -3.086,-1.977 ; -3.086,-2.485 -3.086,-1.977 ; -3.086,-2.485 -3.086,-1.977 ; -3.086,-1.977 -1.994,-1.977 ; -3.086,-1.977 -1.994,-1.977 ; -3.086,-1.977 -1.994,-1.977 ; -3.048,2.493 -3.048,2.917 ; -3.048,2.493 -3.048,2.917 ; -3.048,2.917 -2.032,2.917 ; -3.048,2.917 -2.032,2.917 ; -3.048,2.917 -2.032,2.917 ; -2.032,2.493 -2.032,2.917 ; -2.032,2.493 3.5,2.493 ; -2.032,2.493 -2.032,2.917 ; -1.994,-2.485 3.5,-2.485 ; -1.994,-2.485 -1.994,-1.977 ; -1.994,-2.485 3.5,-2.485 ; -1.994,-2.485 -1.994,-1.977 ; -1.994,-2.485 3.5,-2.485 ; -1.994,-2.485 -1.994,-1.977 ; 3.5,-2.485 3.5,2.493 ; 3.5,-2.485 3.5,2.493 ; 3.5,-2.485 3.5,2.493
  text "2" at -4.458,0.79 h1
  text "1" at -4.243,-1.53 h1
  text "C" at 3.96,0.705 h1
  text "A" at 3.96,-1.79 h1
3D body "LED_DIALIGHT_570-0100-112F.stp": height 10.41, standoff -3.2, extent -11.12,-2.485 3.5,2.917

## LED_DIALIGHT_570-0100-220F [mm] "3x 2mm LED (Top: Green , Middle: Green, Bot: Blank) PCB Edge Mounting DIALIGHT 570 Serie"
height 10.41
pads (6):
  round 1.7 hole 1: 1(-2.54,-1.27) 2(-2.54,1.27) 3(0,-1.27) 4(0,1.27) 5(2.54,-1.27) 6(2.54,1.27)
Top Overlay:
  lines w0.2: -9.59,-0.9 -10.22,-0.9 cw(c-10.22,0) -10.22,0.9 -9.59,0.9 ; -9.39,-1.651 -9.59,-1.651 -9.59,1.651 -9.39,1.651 ; -9.39,2.485 -9.39,-2.485 -3.086,-2.485 -3.086,-2.3 ; -3.086,2.493 -9.39,2.493 3.5,2.493 ; -3.048,2.493 -3.048,2.705 ; -2.032,2.493 -2.032,2.705 ; -1.994,-2.3 -1.994,-2.485 3.5,-2.485 3.5,-1.977 ; -1.994,2.493 3.5,2.493 ; 3.5,-0.6 3.5,0.6 ; 3.5,2 3.5,2.493
  text "2" at -4.458,0.79 h1
  text "1" at -4.243,-1.53 h1
  text "C" at 3.96,0.705 h1
  text "A" at 3.96,-1.79 h1
Notvisible:
  lines w0.1: -3.04,-1.27 -2.54,-1.27 ; -3.04,-1.27 -2.54,-1.27 ; -3.04,-1.27 -2.54,-1.27 ; -3.04,1.27 -2.54,1.27 ; -3.04,1.27 -2.54,1.27 ; -3.04,1.27 -2.54,1.27 ; -2.54,-1.77 -2.54,-1.27 ; -2.54,-1.77 -2.54,-1.27 ; -2.54,-1.77 -2.54,-1.27 ; -2.54,-1.27 -2.54,-0.77 ; -2.54,-1.27 -2.04,-1.27 ; -2.54,-1.27 -2.04,-1.27 ; -2.54,-1.27 -2.54,-0.77 ; -2.54,-1.27 -2.04,-1.27 ; -2.54,-1.27 -2.54,-0.77 ; -2.54,0.77 -2.54,1.27 ; -2.54,0.77 -2.54,1.27 ; -2.54,0.77 -2.54,1.27 ; -2.54,1.27 -2.54,1.77 ; -2.54,1.27 -2.04,1.27 ; -2.54,1.27 -2.04,1.27 ; -2.54,1.27 -2.54,1.77 ; -2.54,1.27 -2.04,1.27 ; -2.54,1.27 -2.54,1.77 ; -0.5,-1.27 0,-1.27 ; -0.5,-1.27 0,-1.27 ; -0.5,-1.27 0,-1.27 ; -0.5,0 0,0 ; -0.5,0 0,0 ; -0.5,0 0,0 ; -0.5,1.27 0,1.27 ; -0.5,1.27 0,1.27 ; -0.5,1.27 0,1.27 ; 0,-1.77 0,-1.27 ; 0,-1.77 0,-1.27 ; 0,-1.77 0,-1.27 ; 0,-1.27 0,-0.77 ; 0,-1.27 0.5,-1.27 ; 0,-1.27 0.5,-1.27 ; 0,-1.27 0,-0.77 ; 0,-1.27 0.5,-1.27 ; 0,-1.27 0,-0.77 ; 0,-0.5 0,0 ; 0,-0.5 0,0 ; 0,-0.5 0,0 ; 0,0 0,0.5 ; 0,0 0.5,0 ; 0,0 0.5,0 ; 0,0 0,0.5 ; 0,0 0.5,0 ; 0,0 0,0.5 ; 0,0.77 0,1.27 ; 0,0.77 0,1.27 ; 0,0.77 0,1.27 ; 0,1.27 0,1.77 ; 0,1.27 0.5,1.27 ; 0,1.27 0.5,1.27 ; 0,1.27 0,1.77 ; 0,1.27 0.5,1.27 ; 0,1.27 0,1.77 ; 2.04,-1.27 2.54,-1.27 ; 2.04,-1.27 2.54,-1.27 ; 2.04,-1.27 2.54,-1.27 ; 2.04,1.27 2.54,1.27 ; 2.04,1.27 2.54,1.27 ; 2.04,1.27 2.54,1.27 ; 2.54,-1.77 2.54,-1.27 ; 2.54,-1.77 2.54,-1.27 ; 2.54,-1.77 2.54,-1.27 ; 2.54,-1.27 2.54,-0.77 ; 2.54,-1.27 3.04,-1.27 ; 2.54,-1.27 3.04,-1.27 ; 2.54,-1.27 2.54,-0.77 ; 2.54,-1.27 3.04,-1.27 ; 2.54,-1.27 2.54,-0.77 ; 2.54,0.77 2.54,1.27 ; 2.54,0.77 2.54,1.27 ; 2.54,0.77 2.54,1.27 ; 2.54,1.27 2.54,1.77 ; 2.54,1.27 3.04,1.27 ; 2.54,1.27 3.04,1.27 ; 2.54,1.27 2.54,1.77 ; 2.54,1.27 3.04,1.27 ; 2.54,1.27 2.54,1.77
Mechanical 14:
  lines w0.1: -3.048,2.485 -3.048,2.917 ; -2.032,2.485 -2.032,2.917 ; -10.22,-0.9 cw(c-10.22,0) -10.22,0.9 ; -10.22,-0.9 cw(c-10.22,0) -10.22,0.9 ; -10.22,-0.9 cw(c-10.22,0) -10.22,0.9 ; -10.22,-0.9 -9.59,-0.9 ; -10.22,-0.9 -9.59,-0.9 ; -10.22,-0.9 -9.59,-0.9 ; -10.22,0.9 -9.59,0.9 ; -10.22,0.9 -9.59,0.9 ; -10.22,0.9 -9.59,0.9 ; -9.59,-1.651 -9.59,1.651 ; -9.59,-1.651 -9.39,-1.651 ; -9.59,-1.651 -9.39,-1.651 ; -9.59,-1.651 -9.59,1.651 ; -9.59,-1.651 -9.39,-1.651 ; -9.59,-1.651 -9.59,1.651 ; -9.59,1.651 -9.39,1.651 ; -9.59,1.651 -9.39,1.651 ; -9.59,1.651 -9.39,1.651 ; -9.39,-2.485 -9.39,2.485 ; -9.39,-2.485 -3.086,-2.485 ; -9.39,-2.485 -3.086,-2.485 ; -9.39,-2.485 -9.39,2.485 ; -9.39,-2.485 -3.086,-2.485 ; -9.39,-2.485 -9.39,2.485 ; -9.39,2.493 -3.048,2.493 ; -9.39,2.493 3.5,2.493 ; -9.39,2.493 -3.048,2.493 ; -3.086,-2.485 -3.086,-1.977 ; -3.086,-2.485 -3.086,-1.977 ; -3.086,-2.485 -3.086,-1.977 ; -3.086,-1.977 -1.994,-1.977 ; -3.086,-1.977 -1.994,-1.977 ; -3.086,-1.977 -1.994,-1.977 ; -3.048,2.493 -3.048,2.917 ; -3.048,2.493 -3.048,2.917 ; -3.048,2.917 -2.032,2.917 ; -3.048,2.917 -2.032,2.917 ; -3.048,2.917 -2.032,2.917 ; -2.032,2.493 -2.032,2.917 ; -2.032,2.493 3.5,2.493 ; -2.032,2.493 -2.032,2.917 ; -1.994,-2.485 -1.994,-1.977 ; -1.994,-2.485 3.5,-2.485 ; -1.994,-2.485 3.5,-2.485 ; -1.994,-2.485 -1.994,-1.977 ; -1.994,-2.485 3.5,-2.485 ; -1.994,-2.485 -1.994,-1.977 ; 3.5,-2.485 3.5,2.493 ; 3.5,-2.485 3.5,2.493 ; 3.5,-2.485 3.5,2.493
  text "2" at -4.458,0.79 h1
  text "1" at -4.243,-1.53 h1
  text "C" at 3.96,0.705 h1
  text "A" at 3.96,-1.79 h1
3D body "LED_DIALIGHT_570-0100-220F.stp": height 10.41, standoff -3.2, extent -11.12,-2.485 3.5,2.917

## LED_DIALIGHT_570-0100-222F [mm] "3x Green LED 2mm PCB Edge Mounting DIALIGHT 570 Serie"
height 10.41
pads (6):
  round 1.7 hole 1: 1(-2.54,-1.27) 2(-2.54,1.27) 3(0,-1.27) 4(0,1.27) 5(2.54,-1.27) 6(2.54,1.27)
Top Overlay:
  lines w0.2: -9.59,-0.9 -10.22,-0.9 cw(c-10.22,0) -10.22,0.9 -9.59,0.9 ; -9.39,-1.651 -9.59,-1.651 -9.59,1.651 -9.39,1.651 ; -9.39,2.485 -9.39,-2.485 -3.086,-2.485 -3.086,-2.3 ; -3.086,2.493 -9.39,2.493 3.5,2.493 ; -3.048,2.493 -3.048,2.705 ; -2.032,2.493 -2.032,2.705 ; -1.994,-2.3 -1.994,-2.485 3.5,-2.485 3.5,-1.977 ; -1.994,2.493 3.5,2.493 ; 3.5,-0.6 3.5,0.6 ; 3.5,2 3.5,2.493
  text "A" at 3.96,-1.79 h1
  text "C" at 3.96,0.705 h1
  text "1" at -4.243,-1.53 h1
  text "2" at -4.458,0.79 h1
Notvisible:
  lines w0.1: -3.04,-1.27 -2.54,-1.27 ; -3.04,-1.27 -2.54,-1.27 ; -3.04,-1.27 -2.54,-1.27 ; -3.04,1.27 -2.54,1.27 ; -3.04,1.27 -2.54,1.27 ; -3.04,1.27 -2.54,1.27 ; -2.54,-1.77 -2.54,-1.27 ; -2.54,-1.77 -2.54,-1.27 ; -2.54,-1.77 -2.54,-1.27 ; -2.54,-1.27 -2.54,-0.77 ; -2.54,-1.27 -2.04,-1.27 ; -2.54,-1.27 -2.54,-0.77 ; -2.54,-1.27 -2.04,-1.27 ; -2.54,-1.27 -2.04,-1.27 ; -2.54,-1.27 -2.54,-0.77 ; -2.54,0.77 -2.54,1.27 ; -2.54,0.77 -2.54,1.27 ; -2.54,0.77 -2.54,1.27 ; -2.54,1.27 -2.54,1.77 ; -2.54,1.27 -2.04,1.27 ; -2.54,1.27 -2.54,1.77 ; -2.54,1.27 -2.04,1.27 ; -2.54,1.27 -2.04,1.27 ; -2.54,1.27 -2.54,1.77 ; -0.5,-1.27 0,-1.27 ; -0.5,-1.27 0,-1.27 ; -0.5,-1.27 0,-1.27 ; -0.5,0 0,0 ; -0.5,0 0,0 ; -0.5,0 0,0 ; -0.5,1.27 0,1.27 ; -0.5,1.27 0,1.27 ; -0.5,1.27 0,1.27 ; 0,-1.77 0,-1.27 ; 0,-1.77 0,-1.27 ; 0,-1.77 0,-1.27 ; 0,-1.27 0,-0.77 ; 0,-1.27 0.5,-1.27 ; 0,-1.27 0,-0.77 ; 0,-1.27 0.5,-1.27 ; 0,-1.27 0.5,-1.27 ; 0,-1.27 0,-0.77 ; 0,-0.5 0,0 ; 0,-0.5 0,0 ; 0,-0.5 0,0 ; 0,0 0,0.5 ; 0,0 0.5,0 ; 0,0 0,0.5 ; 0,0 0.5,0 ; 0,0 0.5,0 ; 0,0 0,0.5 ; 0,0.77 0,1.27 ; 0,0.77 0,1.27 ; 0,0.77 0,1.27 ; 0,1.27 0,1.77 ; 0,1.27 0.5,1.27 ; 0,1.27 0,1.77 ; 0,1.27 0.5,1.27 ; 0,1.27 0.5,1.27 ; 0,1.27 0,1.77 ; 2.04,-1.27 2.54,-1.27 ; 2.04,-1.27 2.54,-1.27 ; 2.04,-1.27 2.54,-1.27 ; 2.04,1.27 2.54,1.27 ; 2.04,1.27 2.54,1.27 ; 2.04,1.27 2.54,1.27 ; 2.54,-1.77 2.54,-1.27 ; 2.54,-1.77 2.54,-1.27 ; 2.54,-1.77 2.54,-1.27 ; 2.54,-1.27 2.54,-0.77 ; 2.54,-1.27 3.04,-1.27 ; 2.54,-1.27 2.54,-0.77 ; 2.54,-1.27 3.04,-1.27 ; 2.54,-1.27 3.04,-1.27 ; 2.54,-1.27 2.54,-0.77 ; 2.54,0.77 2.54,1.27 ; 2.54,0.77 2.54,1.27 ; 2.54,0.77 2.54,1.27 ; 2.54,1.27 2.54,1.77 ; 2.54,1.27 3.04,1.27 ; 2.54,1.27 2.54,1.77 ; 2.54,1.27 3.04,1.27 ; 2.54,1.27 3.04,1.27 ; 2.54,1.27 2.54,1.77
Mechanical 14:
  lines w0.1: -3.048,2.485 -3.048,2.917 ; -2.032,2.485 -2.032,2.917 ; -10.22,-0.9 cw(c-10.22,0) -10.22,0.9 ; -10.22,-0.9 cw(c-10.22,0) -10.22,0.9 ; -10.22,-0.9 cw(c-10.22,0) -10.22,0.9 ; -10.22,-0.9 -9.59,-0.9 ; -10.22,-0.9 -9.59,-0.9 ; -10.22,-0.9 -9.59,-0.9 ; -10.22,0.9 -9.59,0.9 ; -10.22,0.9 -9.59,0.9 ; -10.22,0.9 -9.59,0.9 ; -9.59,-1.651 -9.59,1.651 ; -9.59,-1.651 -9.39,-1.651 ; -9.59,-1.651 -9.59,1.651 ; -9.59,-1.651 -9.39,-1.651 ; -9.59,-1.651 -9.39,-1.651 ; -9.59,-1.651 -9.59,1.651 ; -9.59,1.651 -9.39,1.651 ; -9.59,1.651 -9.39,1.651 ; -9.59,1.651 -9.39,1.651 ; -9.39,-2.485 -9.39,2.485 ; -9.39,-2.485 -3.086,-2.485 ; -9.39,-2.485 -9.39,2.485 ; -9.39,-2.485 -3.086,-2.485 ; -9.39,-2.485 -3.086,-2.485 ; -9.39,-2.485 -9.39,2.485 ; -9.39,2.493 -3.048,2.493 ; -9.39,2.493 3.5,2.493 ; -9.39,2.493 -3.048,2.493 ; -3.086,-2.485 -3.086,-1.977 ; -3.086,-2.485 -3.086,-1.977 ; -3.086,-2.485 -3.086,-1.977 ; -3.086,-1.977 -1.994,-1.977 ; -3.086,-1.977 -1.994,-1.977 ; -3.086,-1.977 -1.994,-1.977 ; -3.048,2.493 -3.048,2.917 ; -3.048,2.493 -3.048,2.917 ; -3.048,2.917 -2.032,2.917 ; -3.048,2.917 -2.032,2.917 ; -3.048,2.917 -2.032,2.917 ; -2.032,2.493 -2.032,2.917 ; -2.032,2.493 3.5,2.493 ; -2.032,2.493 -2.032,2.917 ; -1.994,-2.485 -1.994,-1.977 ; -1.994,-2.485 3.5,-2.485 ; -1.994,-2.485 -1.994,-1.977 ; -1.994,-2.485 3.5,-2.485 ; -1.994,-2.485 3.5,-2.485 ; -1.994,-2.485 -1.994,-1.977 ; 3.5,-2.485 3.5,2.493 ; 3.5,-2.485 3.5,2.493 ; 3.5,-2.485 3.5,2.493
  text "A" at 3.96,-1.79 h1
  text "C" at 3.96,0.705 h1
  text "1" at -4.243,-1.53 h1
  text "2" at -4.458,0.79 h1
3D body "LED_DIALIGHT_570-0100-222F.stp": height 10.41, standoff -3.2, extent -11.12,-2.485 3.5,2.917

## LED_DIALIGHT_570-0100-223F [mm] "3x 2mm LED (Top: Green , Middle: Green, Bot: Yellow) PCB Edge Mounting DIALIGHT 570 Serie"
height 10.41
pads (6):
  round 1.7 hole 1: 1(-2.54,-1.27) 2(-2.54,1.27) 3(0,-1.27) 4(0,1.27) 5(2.54,-1.27) 6(2.54,1.27)
Top Overlay:
  lines w0.2: -9.59,-0.9 -10.22,-0.9 cw(c-10.22,0) -10.22,0.9 -9.59,0.9 ; -9.39,-1.651 -9.59,-1.651 -9.59,1.651 -9.39,1.651 ; -9.39,2.485 -9.39,-2.485 -3.086,-2.485 -3.086,-2.3 ; -3.086,2.493 -9.39,2.493 3.5,2.493 ; -3.048,2.493 -3.048,2.7 ; -2.032,2.493 -2.032,2.705 ; -1.994,-2.3 -1.994,-2.485 3.5,-2.485 3.5,-1.977 ; -1.994,2.493 3.5,2.493 ; 3.5,-0.6 3.5,0.6 ; 3.5,2 3.5,2.493
  text "2" at -4.458,0.79 h1
  text "1" at -4.243,-1.53 h1
  text "C" at 3.96,0.705 h1
  text "A" at 3.96,-1.79 h1
Notvisible:
  lines w0.1: -3.04,-1.27 -2.54,-1.27 ; -3.04,-1.27 -2.54,-1.27 ; -3.04,-1.27 -2.54,-1.27 ; -3.04,1.27 -2.54,1.27 ; -3.04,1.27 -2.54,1.27 ; -3.04,1.27 -2.54,1.27 ; -2.54,-1.77 -2.54,-1.27 ; -2.54,-1.77 -2.54,-1.27 ; -2.54,-1.77 -2.54,-1.27 ; -2.54,-1.27 -2.04,-1.27 ; -2.54,-1.27 -2.54,-0.77 ; -2.54,-1.27 -2.04,-1.27 ; -2.54,-1.27 -2.54,-0.77 ; -2.54,-1.27 -2.04,-1.27 ; -2.54,-1.27 -2.54,-0.77 ; -2.54,0.77 -2.54,1.27 ; -2.54,0.77 -2.54,1.27 ; -2.54,0.77 -2.54,1.27 ; -2.54,1.27 -2.04,1.27 ; -2.54,1.27 -2.54,1.77 ; -2.54,1.27 -2.04,1.27 ; -2.54,1.27 -2.54,1.77 ; -2.54,1.27 -2.04,1.27 ; -2.54,1.27 -2.54,1.77 ; -0.5,-1.27 0,-1.27 ; -0.5,-1.27 0,-1.27 ; -0.5,-1.27 0,-1.27 ; -0.5,0 0,0 ; -0.5,0 0,0 ; -0.5,0 0,0 ; -0.5,1.27 0,1.27 ; -0.5,1.27 0,1.27 ; -0.5,1.27 0,1.27 ; 0,-1.77 0,-1.27 ; 0,-1.77 0,-1.27 ; 0,-1.77 0,-1.27 ; 0,-1.27 0.5,-1.27 ; 0,-1.27 0,-0.77 ; 0,-1.27 0.5,-1.27 ; 0,-1.27 0,-0.77 ; 0,-1.27 0.5,-1.27 ; 0,-1.27 0,-0.77 ; 0,-0.5 0,0 ; 0,-0.5 0,0 ; 0,-0.5 0,0 ; 0,0 0.5,0 ; 0,0 0,0.5 ; 0,0 0.5,0 ; 0,0 0,0.5 ; 0,0 0.5,0 ; 0,0 0,0.5 ; 0,0.77 0,1.27 ; 0,0.77 0,1.27 ; 0,0.77 0,1.27 ; 0,1.27 0.5,1.27 ; 0,1.27 0,1.77 ; 0,1.27 0.5,1.27 ; 0,1.27 0,1.77 ; 0,1.27 0.5,1.27 ; 0,1.27 0,1.77 ; 2.04,-1.27 2.54,-1.27 ; 2.04,-1.27 2.54,-1.27 ; 2.04,-1.27 2.54,-1.27 ; 2.04,1.27 2.54,1.27 ; 2.04,1.27 2.54,1.27 ; 2.04,1.27 2.54,1.27 ; 2.54,-1.77 2.54,-1.27 ; 2.54,-1.77 2.54,-1.27 ; 2.54,-1.77 2.54,-1.27 ; 2.54,-1.27 3.04,-1.27 ; 2.54,-1.27 2.54,-0.77 ; 2.54,-1.27 3.04,-1.27 ; 2.54,-1.27 2.54,-0.77 ; 2.54,-1.27 3.04,-1.27 ; 2.54,-1.27 2.54,-0.77 ; 2.54,0.77 2.54,1.27 ; 2.54,0.77 2.54,1.27 ; 2.54,0.77 2.54,1.27 ; 2.54,1.27 3.04,1.27 ; 2.54,1.27 2.54,1.77 ; 2.54,1.27 3.04,1.27 ; 2.54,1.27 2.54,1.77 ; 2.54,1.27 3.04,1.27 ; 2.54,1.27 2.54,1.77
Mechanical 14:
  lines w0.1: -3.048,2.485 -3.048,2.917 ; -2.032,2.485 -2.032,2.917 ; -10.22,-0.9 cw(c-10.22,0) -10.22,0.9 ; -10.22,-0.9 cw(c-10.22,0) -10.22,0.9 ; -10.22,-0.9 cw(c-10.22,0) -10.22,0.9 ; -10.22,-0.9 -9.59,-0.9 ; -10.22,-0.9 -9.59,-0.9 ; -10.22,-0.9 -9.59,-0.9 ; -10.22,0.9 -9.59,0.9 ; -10.22,0.9 -9.59,0.9 ; -10.22,0.9 -9.59,0.9 ; -9.59,-1.651 -9.39,-1.651 ; -9.59,-1.651 -9.59,1.651 ; -9.59,-1.651 -9.39,-1.651 ; -9.59,-1.651 -9.59,1.651 ; -9.59,-1.651 -9.39,-1.651 ; -9.59,-1.651 -9.59,1.651 ; -9.59,1.651 -9.39,1.651 ; -9.59,1.651 -9.39,1.651 ; -9.59,1.651 -9.39,1.651 ; -9.39,-2.485 -3.086,-2.485 ; -9.39,-2.485 -9.39,2.485 ; -9.39,-2.485 -3.086,-2.485 ; -9.39,-2.485 -9.39,2.485 ; -9.39,-2.485 -3.086,-2.485 ; -9.39,-2.485 -9.39,2.485 ; -9.39,2.493 3.5,2.493 ; -9.39,2.493 -3.048,2.493 ; -9.39,2.493 -3.048,2.493 ; -3.086,-2.485 -3.086,-1.977 ; -3.086,-2.485 -3.086,-1.977 ; -3.086,-2.485 -3.086,-1.977 ; -3.086,-1.977 -1.994,-1.977 ; -3.086,-1.977 -1.994,-1.977 ; -3.086,-1.977 -1.994,-1.977 ; -3.048,2.493 -3.048,2.917 ; -3.048,2.493 -3.048,2.917 ; -3.048,2.917 -2.032,2.917 ; -3.048,2.917 -2.032,2.917 ; -3.048,2.917 -2.032,2.917 ; -2.032,2.493 -2.032,2.917 ; -2.032,2.493 3.5,2.493 ; -2.032,2.493 -2.032,2.917 ; -1.994,-2.485 3.5,-2.485 ; -1.994,-2.485 -1.994,-1.977 ; -1.994,-2.485 3.5,-2.485 ; -1.994,-2.485 -1.994,-1.977 ; -1.994,-2.485 3.5,-2.485 ; -1.994,-2.485 -1.994,-1.977 ; 3.5,-2.485 3.5,2.493 ; 3.5,-2.485 3.5,2.493 ; 3.5,-2.485 3.5,2.493
  text "2" at -4.458,0.79 h1
  text "1" at -4.243,-1.53 h1
  text "C" at 3.96,0.705 h1
  text "A" at 3.96,-1.79 h1
3D body "LED_DIALIGHT_570-0100-223F.stp": height 10.41, standoff -3.2, extent -11.12,-2.485 3.5,2.917